# Altium footprint library PCB1.PcbLib: 47 footprints (part 1 of 3)
Each footprint in its own frame and in the unit in brackets; x right, y up, seen from the top. Pads: shape width x height; smd on the part's side, far side on the other; paste and mask are expansions set on the pad; w line width, h text height; cw(c..) or ccw(c..) is an arc to the next point about the centre after c.
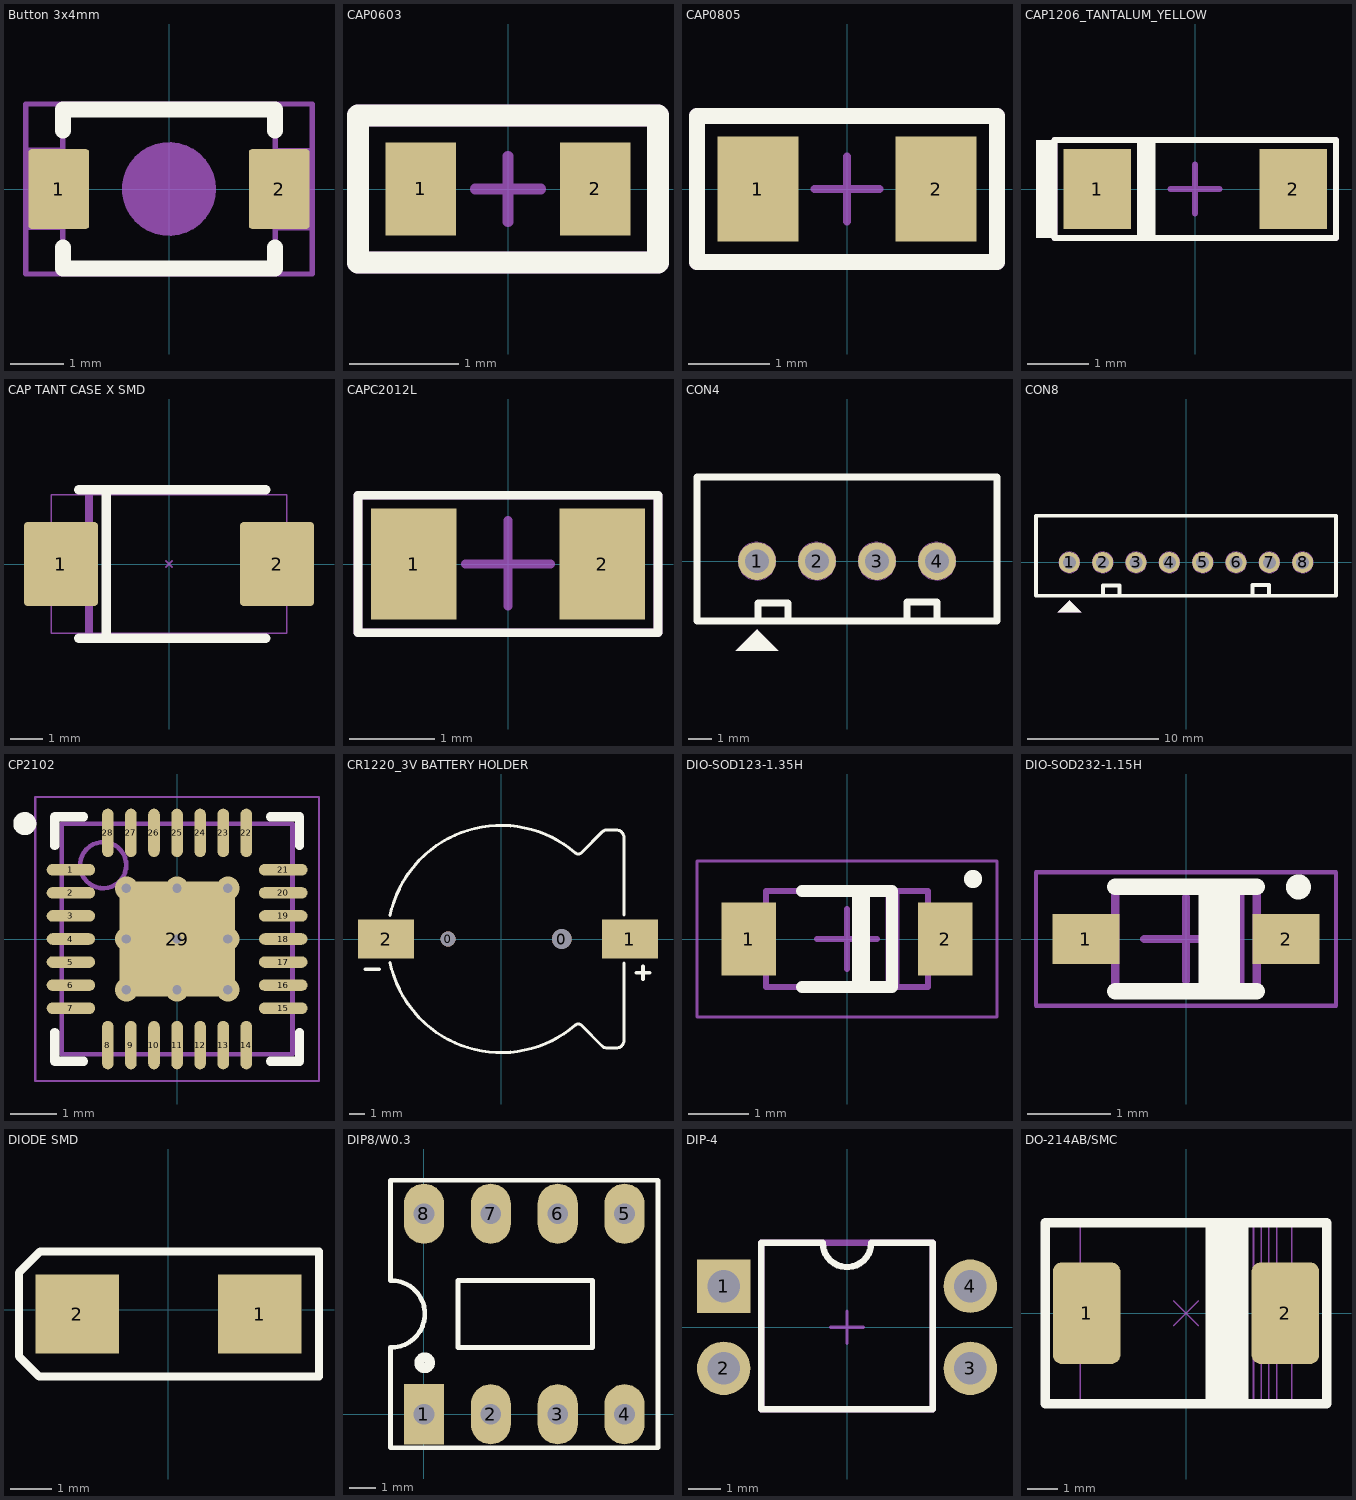
[diagram p0: the footprints below, top view; thin cyan lines are the x and y axes]

## Button 3x4mm [mm] "SMD 3x4mm"
pads (2):
  rrect10% 1.143x1.5 smd: 1(-2.075,0) 2(2.075,0)
Top Overlay:
  lines w0.3: -2,-1.1 -2,-1.5 2,-1.5 2,-1.1 ; -2,1.1 -2,1.5 2,1.5 2,1.1
Mechanical 2:
  circle w0.05: c0,0 r0.861
  region: -0.085,-0.861 -0.251,-0.828 -0.408,-0.763 -0.549,-0.669 -0.669,-0.549 -0.763,-0.408 -0.828,-0.251 -0.861,-0.085 -0.861,0 -0.861,0.085 -0.828,0.251 -0.763,0.408 -0.669,0.549 -0.549,0.669 -0.408,0.763 -0.251,0.828 -0.085,0.861 0,0.861 0.085,0.861 0.251,0.828 0.408,0.763 0.549,0.669 0.669,0.549 0.763,0.408 0.828,0.251 0.861,0.085 0.861,-0.085 0.828,-0.251 0.763,-0.408 0.669,-0.549 0.549,-0.669 0.408,-0.763 0.251,-0.828 0.085,-0.861
  lines w0.05: -2.007,0.752 -2.64,0.752 -2.64,-0.744 -2,-0.744 ; 2,0.744 2.64,0.744 2.64,-0.752 2.007,-0.752 ; -2,-1.5 2,-1.5 2,1.5 -2,1.5 -2,-1.5
Mechanical 13:
  lines w0.1: -2,-1.5 -2,1.5 2,1.5 2,-1.5 -2,-1.5
Mechanical 15:
  lines w0.1: -0.5,0 0.5,0 ; 0,-0.5 0,0.5 ; -2.7,-1.6 -2.7,1.6 2.7,1.6 2.7,-1.6 -2.7,-1.6
3D body "SMT Tactile Switch PTS-820.STEP": height 2.05, standoff -0.5, extent -2.25,-1.55 2.25,1.55

## CAP0603 [mm]
pads (2):
  rect 0.65x0.85 smd: 1(-0.8,0) 2(0.8,0)
Top Overlay:
  lines w0.2: -1.375,-0.675 1.375,-0.675 1.375,0.675 -1.375,0.675 -1.375,-0.675
Mechanical 13:
  lines w0.2: -1.375,-0.675 1.375,-0.675 1.375,0.675 -1.375,0.675 -1.375,-0.675
  text "'.Designator'" at -1.03,-0.63 h0.7
Mechanical 15:
  lines w0.1: -0.3,0 0.3,0 ; 0,-0.3 0,0.3
3D body "User Library-cap_0603-1.STEP": height 0.79, standoff -0.01, extent -0.8,-0.4 0.8,0.4

## CAP0805 [mm]
pads (2):
  rect 1x1.3 smd: 1(-1.1,0) 2(1.1,0)
Top Overlay:
  lines w0.2: -1.85,-0.9 -1.85,0.9 1.85,0.9 1.85,-0.9 -1.85,-0.9
Mechanical 13:
  lines w0.2: -1.85,-0.9 1.85,-0.9 1.85,0.9 -1.85,0.9 -1.85,-0.9
  text "'.Designator'" at -1.475,-0.725 h0.8
Mechanical 15:
  lines w0.1: -0.4,0 0.4,0 ; 0,-0.4 0,0.4
3D body "cap_2012.stp": height 0.65, standoff -0.03, extent -1.2,-0.73 1.2,0.73

## CAP1206_TANTALUM_YELLOW [mm]
pads (2):
  rect 1.1x1.3 smd: 1(-1.6,0) 2(1.6,0)
Top Overlay:
  rectangle: -0.95,-0.8 -0.65,0.8
  rectangle: -2.6,-0.8 -2.3,0.8
  lines w0.1: -2.3,-0.8 2.3,-0.8 2.3,0.8 -2.3,0.8 -2.3,-0.8
Mechanical 13:
  lines w0.1: -2.3,-0.8 2.3,-0.8 2.3,0.8 -2.3,0.8 -2.3,-0.8
Mechanical 15:
  lines w0.1: -0.4,0 0.4,0 ; 0,-0.4 0,0.4
3D body "User Library-CAP_TANT_3216-18_A_case-1.step": height 1.75, standoff 0.05, extent -1.7,-0.9 1.7,0.9

## CAP TANT CASE X SMD [mm]
height 4
pads (2):
  rrect10% 2.3x2.6 smd mask+0.1: 1(-3.35,0) 2(3.35,0)
Top Overlay:
  lines w0.3: -2.8,-2.3 3,-2.3 ; -2.8,2.3 3,2.3 ; -1.948,-2.3 -1.948,2.3
Mechanical 2:
  rectangle: -2.61,-2.15 -2.35,2.15
  lines w0.05: -3.2,0 -2.9,0 ; -3.05,-0.15 -3.05,0.15 ; -0.1,-0.1 0.1,0.1 ; -0.1,0.1 0.1,-0.1 ; -3.65,-2.15 -3.65,2.15 3.65,2.15 3.65,-2.15 -3.65,-2.15
3D body "User Library-CaseX_7343-43.STEP": height 4, standoff 0, extent -3.65,-2.15 3.65,2.15

## CAPC2012L [mm] "Chip Capacitor, Body 2.0x1.3mm, IPC High Density"
height 1.1
pads (2):
  rect 1x1.3 smd: 1(-1.1,0) 2(1.1,0)
Top Overlay:
  lines w0.1: -1.75,-0.8 1.75,-0.8 1.75,0.8 -1.75,0.8 -1.75,-0.8
Mechanical 13:
  lines w0.1: -1.75,-0.8 -1.75,0.8 1.75,0.8 1.75,-0.8 -1.75,-0.8
Mechanical 15:
  lines w0.1: -0.5,0 0.5,0 ; 0,-0.49 0,0.51
3D body "cap_2012.stp": height 0.65, standoff -0.03, extent -1.19,-0.72 1.21,0.74

## CON4 [mm] "CON4"
height 5.08
pads (4):
  round 1.6 hole 1 mask+0.1: 1(-3.81,0) 2(-1.27,0) 3(1.27,0) 4(3.81,0)
Top Overlay:
  region: -4.712,-3.797 -2.908,-3.797 -3.797,-2.908 -3.797,-2.883
  lines w0.3: -3.759,-2.54 -3.759,-1.778 -2.489,-1.778 -2.489,-2.54 ; 2.54,-2.489 2.54,-1.727 3.81,-1.727 3.81,-2.489 ; -6.35,-2.54 6.35,-2.54 6.35,0 6.35,3.556 -6.35,3.556 -6.35,-2.54
Mechanical 2:
  circle w0.05: c1.27,0 r0.8
  circle w0.05: c-1.27,0 r0.8
  circle w0.05: c3.81,0 r0.8
  circle w0.05: c-3.81,0 r0.8
  region: -4.712,-3.797 -2.908,-3.797 -3.797,-2.908 -3.797,-2.883
  lines w0.05: -3.759,-2.54 -3.759,-1.778 -2.489,-1.778 -2.489,-2.54 ; 2.54,-2.489 2.54,-1.727 3.81,-1.727 3.81,-2.489 ; -6.35,-2.54 6.35,-2.54 6.35,0 6.35,3.556 -6.35,3.556 -6.35,-2.54
  text "4" at 3.4,-0.5 h1
  text "1" at -3.9,-0.5 h1
3D body "User Library-PW10_4.step": height 7, standoff -3.3, extent -6.25,-2.286 6.25,3.414

## CON8 [mm] "CON8"
height 5.08
pads (8):
  round 1.6 hole 1 mask+0.1: 1(-8.89,0) 2(-6.35,0) 3(-3.81,0) 4(-1.27,0) 5(1.27,0) 6(3.81,0) 7(6.35,0) 8(8.89,0)
Top Overlay:
  region: -9.792,-3.797 -7.988,-3.797 -8.877,-2.908 -8.877,-2.883
  lines w0.3: -6.325,-2.515 -6.325,-1.753 -5.055,-1.753 -5.055,-2.515 ; 5.055,-2.489 5.055,-1.727 6.325,-1.727 6.325,-2.489 ; -11.43,-2.54 -11.43,3.556 11.43,3.556 11.43,0 11.43,-2.54 -11.43,-2.54
Mechanical 1:
  circle w0.05: c-1.27,0 r0.8
  circle w0.05: c1.27,0 r0.8
  circle w0.05: c-8.89,0 r0.8
  circle w0.05: c-6.35,0 r0.8
  circle w0.05: c-3.81,0 r0.8
  circle w0.05: c3.81,0 r0.8
  circle w0.05: c8.89,0 r0.8
  circle w0.05: c6.35,0 r0.8
  region: -9.792,-3.797 -7.988,-3.797 -8.877,-2.908 -8.877,-2.883
  lines w0.05: -6.325,-2.515 -6.325,-1.753 -5.055,-1.753 -5.055,-2.515 ; 5.055,-2.489 5.055,-1.727 6.325,-1.727 6.325,-2.489 ; -11.43,-2.54 -11.43,3.556 11.43,3.556 11.43,0 11.43,-2.54 -11.43,-2.54
  text "1" at -9,-0.4 h1
  text "CN?" at 0.05,0.05 h0.8
  text "8" at 8.6,-0.5 h1
3D body "User Library-PW10_8.step": height 7, standoff -3.3, extent -11.3,-2.286 11.3,3.414

## CP2102 [mm] "QFN, 28-Leads, Body 5.00x5.00mm, Pitch 0.50mm, Thermal Pad 3.13x3.13mm, IPC Medium Density"
height 0.8
pads (29):
  oval 1.05x0.25 smd: 1(-2.3,1.5) 2(-2.3,1) 3(-2.3,0.5) 4(-2.3,0) 5(-2.3,-0.5) 6(-2.3,-1) 7(-2.3,-1.5) 15(2.3,-1.5) 16(2.3,-1) 17(2.3,-0.5) 18(2.3,0) 19(2.3,0.5) 20(2.3,1) 21(2.3,1.5)
  oval 0.25x1.05 smd: 8(-1.5,-2.3) 9(-1,-2.3) 10(-0.5,-2.3) 11(0,-2.3) 12(0.5,-2.3) 13(1,-2.3) 14(1.5,-2.3) 22(1.5,2.3) 23(1,2.3) 24(0.5,2.3) 25(0,2.3) 26(-0.5,2.3) 27(-1,2.3) 28(-1.5,2.3)
  rect 2.5x2.5 smd: 29(0,0)
via -1.1,0 diameter 0.5 hole 0.2
via 0,-1.1 diameter 0.5 hole 0.2
via -1.1,-1.1 diameter 0.5 hole 0.2
via 0,0 diameter 0.5 hole 0.2
via -1.1,1.1 diameter 0.5 hole 0.2
via 0,1.1 diameter 0.5 hole 0.2
via 1.1,0 diameter 0.5 hole 0.2
via 1.1,-1.1 diameter 0.5 hole 0.2
via 1.1,1.1 diameter 0.5 hole 0.2
Top Overlay:
  circle w0.25: c-3.3,2.5 r0.125
  lines w0.2: -2.65,-2.025 -2.65,-2.65 -2.025,-2.65 ; -2.65,2.025 -2.65,2.65 -2.025,2.65 ; 2.025,-2.65 2.65,-2.65 2.65,-2.025 ; 2.025,2.65 2.65,2.65 2.65,2.025
Mechanical 13:
  circle w0.1: c-1.6,1.6 r0.5
  lines w0.1: -2.5,-2.5 -2.5,2.5 2.5,2.5 2.5,-2.5 -2.5,-2.5
Mechanical 15:
  lines w0.05: -3.075,-3.075 -3.075,3.075 3.075,3.075 3.075,-3.075 -3.075,-3.075
  lines w0.1: -0.5,0 0.5,0 ; 0,-0.5 0,0.5
3D body "CP2102.step": height 0.8, standoff 0, extent -2.51,-2.51 2.51,2.51

## CR1220_3V BATTERY HOLDER [mm] "Xtal for RF"
pads (4):
  round 1 hole 1: 0(-3.5,0)
  round 1.3 hole 1.3: 0(4,0)
  rect 3.7x2.6 smd: 1(8.5,0) 2(-7.6,0)
Top Overlay:
  lines w0.2: -7.336,-1.559 ccw(c0,0) 4.883,-5.693 ; -7.336,1.559 cw(c0,0) 4.883,5.693 ; 4.884,-5.694 cw(c5.09,-5.9) 5.296,-5.694 ; 4.884,5.694 ccw(c5.09,5.9) 5.296,5.694 ; 5.295,-5.695 6.69,-7.09 ; 5.295,5.695 6.678,7.078 6.686,7.078 cw(c6.98,6.784) 6.98,7.2 7.6,7.2 cw(c7.6,6.7) 8.1,6.7 8.1,1.6 ; 6.676,-7.074 ccw(c6.97,-6.78) 6.97,-7.196 7.596,-7.196 ; 7.6,-7.2 ccw(c7.6,-6.7) 8.1,-6.7 8.1,-1.6
  lines w0.254: -8.95,-2 -8.05,-2 ; 8.91,-2.23 9.81,-2.23 ; 9.36,-2.65 9.36,-1.8
3D body "User Library-CR1220-2.STEP": height 3.8, standoff 1.8, extent -6.2,-6.2 6.2,6.2
3D body "User Library-Battery Holder for CR1220 SMD.STEP": height 4.23, standoff -0.52, extent -9,-7.35 9.8,7.399

## DIO-SOD123-1.35H [mm] "SOD123_1N4148WS"
height 1.35
pads (2):
  rect 0.91x1.22 smd: 1(-1.64,0) 2(1.64,0)
Top Overlay:
  circle w0.2: c2.1,1 r0.05
  rectangle: 0.08,-0.8 0.38,0.8
  lines w0.2: -0.75,-0.8 0.75,-0.8 0.75,0.8 -0.75,0.8
Top Assembly:
  rectangle: 0.646,-0.8 0.876,0.8
  lines w0.1: -1.35,-0.8 1.35,-0.8 1.35,0.8 -1.35,0.8 -1.35,-0.8
  text "'.Designator'" at 5.361,-0.802 h1.6
Top Courtyard:
  lines w0.05: -2.5,-1.3 2.5,-1.3 2.5,1.3 -2.5,1.3 -2.5,-1.3
  lines w0.1: -0.5,0 0.5,0 ; 0,-0.5 0,0.5
Top Value:
  rectangle: 0.646,-0.8 0.876,0.8
  lines w0.1: -1.35,-0.8 1.35,-0.8 1.35,0.8 -1.35,0.8 -1.35,-0.8
  text "'.Comment'" at -2.91,-0.512 h1.6
Mechanical 20:
  rectangle: 0.646,-0.8 0.876,0.8
  lines w0.1: -1.35,-0.8 1.35,-0.8 1.35,0.8 -1.35,0.8 -1.35,-0.8
  text "'.Designator'" at 5.361,-0.802 h1.6
3D body "SOD-123.step": height 1.25, standoff 0, extent -1.849,-0.8 1.849,0.8

## DIO-SOD232-1.15H [mm] "SOD323 1.15H SMD (1N4148WS)"
height 1.15
pads (2):
  rect 0.8x0.6 smd: 1(-1.2,0) 2(1.2,0)
Top Overlay:
  circle w0.2: c1.35,0.625 r0.05
  rectangle: 0.15,-0.625 0.65,0.625
  lines w0.2: -0.85,-0.625 0.85,-0.625 ; -0.85,0.625 0.85,0.625
Top Assembly:
  region: 0.65,0.625 0.35,0.625 0.35,-0.625 0.65,-0.625
  lines w0.1: -0.852,-0.2 -1.345,-0.2 -1.345,0.2 -0.852,0.2 ; 0.35,-0.625 0.35,0.625 ; 0.65,-0.625 0.65,0.625 ; 0.852,-0.2 1.345,-0.2 1.345,0.2 0.852,0.2 ; -0.85,-0.625 -0.85,0.625 0.85,0.625 0.85,-0.625 -0.85,-0.625
  text "'.Designator'" at -1.229,-0.506 h1.6
Top Courtyard:
  lines w0.05: -1.8,-0.8 1.8,-0.8 1.8,0.8 -1.8,0.8 -1.8,-0.8
  lines w0.1: -0.5,0 0.5,0 ; 0,-0.5 0,0.5
Top Value:
  region: 0.65,0.625 0.35,0.625 0.35,-0.625 0.65,-0.625
  lines w0.1: -0.852,-0.2 -1.345,-0.2 -1.345,0.2 -0.852,0.2 ; 0.35,-0.625 0.35,0.625 ; 0.65,-0.625 0.65,0.625 ; 0.852,-0.2 1.345,-0.2 1.345,0.2 0.852,0.2 ; -0.85,-0.625 0.85,-0.625 0.85,0.625 -0.85,0.625 -0.85,-0.625
  text "'.Comment'" at -3.312,-0.512 h1.6
Mechanical 20:
  region: 0.65,0.625 0.35,0.625 0.35,-0.625 0.65,-0.625
  lines w0.1: -0.852,-0.2 -1.345,-0.2 -1.345,0.2 -0.852,0.2 ; 0.35,-0.625 0.35,0.625 ; 0.65,-0.625 0.65,0.625 ; 0.852,-0.2 1.345,-0.2 1.345,0.2 0.852,0.2 ; -0.85,-0.625 0.85,-0.625 0.85,0.625 -0.85,0.625 -0.85,-0.625
  text "'.Designator'" at -1.229,-0.506 h1.6
3D body "SOD2513X11.STEP": height 1.1, standoff 0, extent -1.35,-0.625 1.35,0.625

## DIODE SMD [mm]
pads (2):
  rect 2x1.9 smd: 1(2.184,-0.102) 2(-2.184,-0.102)
Top Overlay:
  lines w0.2: -3.581,-1.118 -3.099,-1.6 3.607,-1.6 3.607,1.397 -3.073,1.397 -3.581,0.889 -3.581,-0.344 -3.581,-1.118
3D body "SMB.STEP": height 2.3, standoff 0.02, extent -2.667,-1.498 2.82,1.296

## DIP8/W0.3 [mil] "8 PIN, W 300mil, Pin to pin 100mil"
height 100
pads (8):
  rect 60x90 hole 31: 1(0,0)
  oval 60x90 hole 31: 2(100,0) 3(200,0) 4(300,0) 5(300,300) 6(200,300) 7(100,300) 8(0,300)
Top Overlay:
  circle w15: c1,77 r8
  lines w7: -50.38,100.05 ccw(c-48.69,150.02) -50,200 ; -50,100 -50,-50 350,-50 350,350 -50,350 -50,201 ; 51,100 51,200 252,200 252,100 51,100
3D body "SW3dPS-DIP8-CER.STEP": height 201.25, standoff -129.47, extent -50,-40 350,336.4

## DIP-4 [mm] "DIP, 4-Pin, Row Spacing 7.62 mm, Pitch 2.54 mm"
height 5.33
pads (4):
  rect 1.65x1.65 hole 1: 1(-3.81,1.27)
  round 1.65 hole 1: 2(-3.81,-1.27) 3(3.81,-1.27) 4(3.81,1.27)
Top Overlay:
  lines w0.2: -2.65,-2.54 2.65,-2.54 2.65,2.61 0.75,2.61 cw(c0,2.61) -0.75,2.61 -2.65,2.61 -2.65,-2.54
Top Assembly:
  lines w0.2: -2.65,-2.54 2.65,-2.54 2.65,2.61 -2.65,2.61 -2.65,-2.54
Mechanical 15:
  lines w0.1: -0.5,0 0.5,0 ; 0,-0.5 0,0.5
3D body "User Library-DIP4-7_62-2_54.STEP": height 4.3, standoff -2.7, extent -3.94,-2.285 3.94,2.305

## DO-214AB/SMC [mm]
height 8.6
pads (2):
  rrect25% 2.2x3.3 smd mask+0.1: 1(-3.238,0) 2(3.238,0)
Top Overlay:
  rectangle: 0.63,-3 2.035,2.93
  lines w0.3: -4.59,-2.95 -4.59,2.95 4.59,2.95 4.59,-2.95 -4.59,-2.95
Mechanical 2:
  lines w0.05: -3.45,-1.5 -3.85,-1.5 -3.85,1.5 -3.45,1.5 ; -0.4,-0.4 0.4,0.4 ; -0.4,0.4 0.4,-0.4 ; 1.95,-2.95 1.95,2.95 ; 2.2,-2.95 2.2,2.95 ; 2.45,-2.95 2.45,2.95 ; 2.7,-2.95 2.7,2.95 ; 2.95,-2.95 2.95,2.95 ; 3.45,-1.5 3.85,-1.5 3.85,1.5 3.45,1.5 ; -3.45,-2.95 -3.45,2.95 3.45,2.95 3.45,-2.95 -3.45,-2.95
  text "A" at -4.8,-0.6 h1
  text ".Designator" at 0,0 h0.4
  text "K" at 3.7,-0.6 h1
3D body "SW3dPS-DO-214AB SMC.STEP": height 2.2, standoff -0.1, extent -4.102,-2.95 3.848,2.95